# Altium footprint library Components.PcbLib: 260 footprints (part 11 of 17)
Each footprint in its own frame and in the unit in brackets; x right, y up, seen from the top. Pads: shape width x height; smd on the part's side, far side on the other; paste and mask are expansions set on the pad; w line width, h text height; cw(c..) or ccw(c..) is an arc to the next point about the centre after c.
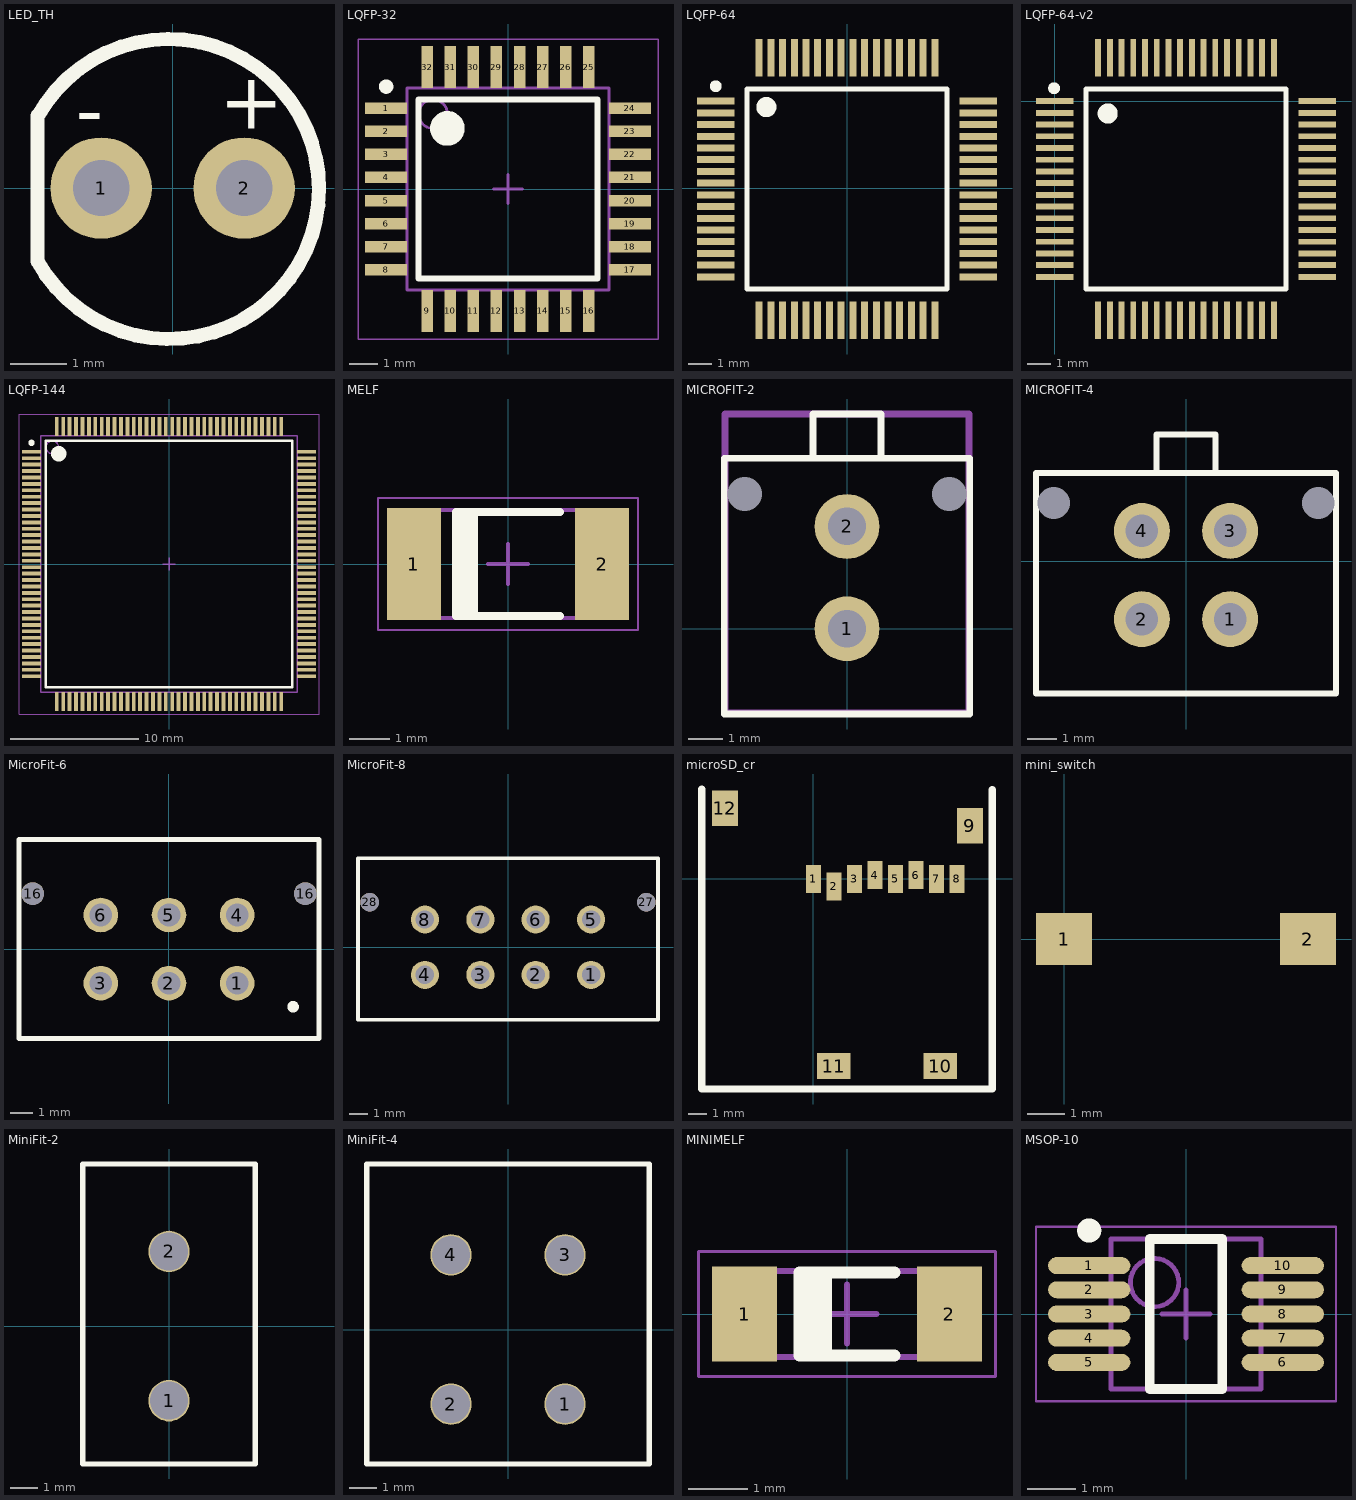
[diagram p10: the footprints below, top view; thin cyan lines are the x and y axes]

## LED_TH [mm]
pads (2):
  round 1.8 hole 1: 1(-1.27,0) 2(1.27,0)
Top Overlay:
  lines w0.254: -2.4,1.284 -2.4,-1.3 ccw(c-0.065,-0.017) -2.39,1.284
  text "-" at -1.725,0.9 h1
  text "+" at 0.825,1.05 h1

## LQFP-32 [mm]
height 1.6
pads (32):
  rect 1.45x0.4 smd: 1(-4.225,2.8) 2(-4.225,2) 3(-4.225,1.2) 4(-4.225,0.4) 5(-4.225,-0.4) 6(-4.225,-1.2) 7(-4.225,-2) 8(-4.225,-2.8) 17(4.225,-2.8) 18(4.225,-2) 19(4.225,-1.2) 20(4.225,-0.4) 21(4.225,0.4) 22(4.225,1.2) 23(4.225,2) 24(4.225,2.8)
  rect 0.4x1.45 smd: 9(-2.8,-4.225) 10(-2,-4.225) 11(-1.2,-4.225) 12(-0.4,-4.225) 13(0.4,-4.225) 14(1.2,-4.225) 15(2,-4.225) 16(2.8,-4.225) 25(2.8,4.225) 26(2,4.225) 27(1.2,4.225) 28(0.4,4.225) 29(-0.4,4.225) 30(-1.2,4.225) 31(-2,4.225) 32(-2.8,4.225)
Top Overlay:
  circle w0.25: c-4.225,3.55 r0.125
  circle w0.6: c-2.1,2.1 r0.3
  lines w0.2: -3.1,-3.1 -3.1,3.1 3.1,3.1 3.1,-3.1 -3.1,-3.1
Mechanical 13:
  circle w0.1: c-2.6,2.6 r0.5
  lines w0.1: -3.5,-3.5 -3.5,3.5 3.5,3.5 3.5,-3.5 -3.5,-3.5
Mechanical 15:
  lines w0.05: -5.2,-5.2 -5.2,5.2 5.2,5.2 5.2,-5.2 -5.2,-5.2
  lines w0.1: -0.5,0 0.5,0 ; 0,-0.5 0,0.5
3D body "LQFP-32.STEP": height 1.63, standoff -0.09, extent -4.5,-4.5 4.5,4.5

## LQFP-64 [mm]
pads (64):
  rect 1.6x0.3 smd: 1(-5.6,3.725) 2(-5.6,3.225) 3(-5.6,2.725) 4(-5.6,2.225) 5(-5.6,1.725) 6(-5.6,1.225) 7(-5.6,0.725) 8(-5.6,0.225) 9(-5.6,-0.275) 10(-5.6,-0.775) 11(-5.6,-1.275) 12(-5.6,-1.775) 13(-5.6,-2.275) 14(-5.6,-2.775) 15(-5.6,-3.275) 16(-5.6,-3.775) 33(5.6,-3.775) 34(5.6,-3.275) 35(5.6,-2.775) 36(5.6,-2.275) 37(5.6,-1.775) 38(5.6,-1.275) 39(5.6,-0.775) 40(5.6,-0.275) 41(5.6,0.225) 42(5.6,0.725) 43(5.6,1.225) 44(5.6,1.725) 45(5.6,2.225) 46(5.6,2.725) 47(5.6,3.225) 48(5.6,3.725)
  rect 0.3x1.6 smd: 17(-3.75,-5.625) 18(-3.25,-5.625) 19(-2.75,-5.625) 20(-2.25,-5.625) 21(-1.75,-5.625) 22(-1.25,-5.625) 23(-0.75,-5.625) 24(-0.25,-5.625) 25(0.25,-5.625) 26(0.75,-5.625) 27(1.25,-5.625) 28(1.75,-5.625) 29(2.25,-5.625) 30(2.75,-5.625) 31(3.25,-5.625) 32(3.75,-5.625) 49(3.75,5.575) 50(3.25,5.575) 51(2.75,5.575) 52(2.25,5.575) 53(1.75,5.575) 54(1.25,5.575) 55(0.75,5.575) 56(0.25,5.575) 57(-0.25,5.575) 58(-0.75,5.575) 59(-1.25,5.575) 60(-1.75,5.575) 61(-2.25,5.575) 62(-2.75,5.575) 63(-3.25,5.575) 64(-3.75,5.575)
Top Overlay:
  circle w0.6: c-3.441,3.471 r0.127
  circle w0.25: c-5.6,4.36 r0.127
  lines w0.2: -4.265,-4.29 -4.265,4.24 4.265,4.24 4.265,-4.29 -4.265,-4.29
3D body "LQFP64.stp": height 1.5, standoff 0, extent -5.998,-6.036 6.025,5.986

## LQFP-64-v2 [mm]
pads (64):
  rect 1.6x0.25 smd: 1(0,0) 2(0,-0.5) 3(0,-1) 4(0,-1.5) 5(0,-2) 6(0,-2.5) 7(0,-3) 8(0,-3.5) 9(0,-4) 10(0,-4.5) 11(0,-5) 12(0,-5.5) 13(0,-6) 14(0,-6.5) 15(0,-7) 16(0,-7.5) 33(11.2,-7.5) 34(11.2,-7) 35(11.2,-6.5) 36(11.2,-6) 37(11.2,-5.5) 38(11.2,-5) 39(11.2,-4.5) 40(11.2,-4) 41(11.2,-3.5) 42(11.2,-3) 43(11.2,-2.5) 44(11.2,-2) 45(11.2,-1.5) 46(11.2,-1) 47(11.2,-0.5) 48(11.2,0)
  rect 0.25x1.6 smd: 17(1.85,-9.35) 18(2.35,-9.35) 19(2.85,-9.35) 20(3.35,-9.35) 21(3.85,-9.35) 22(4.35,-9.35) 23(4.85,-9.35) 24(5.35,-9.35) 25(5.85,-9.35) 26(6.35,-9.35) 27(6.85,-9.35) 28(7.35,-9.35) 29(7.85,-9.35) 30(8.35,-9.35) 31(8.85,-9.35) 32(9.35,-9.35) 49(9.35,1.85) 50(8.85,1.85) 51(8.35,1.85) 52(7.85,1.85) 53(7.35,1.85) 54(6.85,1.85) 55(6.35,1.85) 56(5.85,1.85) 57(5.35,1.85) 58(4.85,1.85) 59(4.35,1.85) 60(3.85,1.85) 61(3.35,1.85) 62(2.85,1.85) 63(2.35,1.85) 64(1.85,1.85)
Top Overlay:
  circle w0.25: c-0.027,0.55 r0.127
  circle w0.6: c2.259,-0.529 r0.127
  lines w0.2: 1.335,-8.015 9.865,-8.015 9.865,0.515 1.335,0.515 1.335,-8.015
3D body "LQFP64.stp": height 1.5, standoff 0, extent -0.411,-9.761 11.611,2.261

## LQFP-144 [mm] "TSQFP, 144-Leads, Body 20,00x20,00mm, Pitch 0,50mm, IPC Medium Density"
height 1.6
pads (144):
  rect 1.45x0.3 smd: 1(-10.725,8.75) 2(-10.725,8.25) 3(-10.725,7.75) 4(-10.725,7.25) 5(-10.725,6.75) 6(-10.725,6.25) 7(-10.725,5.75) 8(-10.725,5.25) 9(-10.725,4.75) 10(-10.725,4.25) 11(-10.725,3.75) 12(-10.725,3.25) 13(-10.725,2.75) 14(-10.725,2.25) 15(-10.725,1.75) 16(-10.725,1.25) 17(-10.725,0.75) 18(-10.725,0.25) 19(-10.725,-0.25) 20(-10.725,-0.75) 21(-10.725,-1.25) 22(-10.725,-1.75) 23(-10.725,-2.25) 24(-10.725,-2.75) 25(-10.725,-3.25) 26(-10.725,-3.75) 27(-10.725,-4.25) 28(-10.725,-4.75) 29(-10.725,-5.25) 30(-10.725,-5.75) 31(-10.725,-6.25) 32(-10.725,-6.75) 33(-10.725,-7.25) 34(-10.725,-7.75) 35(-10.725,-8.25) 36(-10.725,-8.75) 73(10.725,-8.75) 74(10.725,-8.25) 75(10.725,-7.75) 76(10.725,-7.25) 77(10.725,-6.75) 78(10.725,-6.25) 79(10.725,-5.75) 80(10.725,-5.25) 81(10.725,-4.75) 82(10.725,-4.25) 83(10.725,-3.75) 84(10.725,-3.25) 85(10.725,-2.75) 86(10.725,-2.25) 87(10.725,-1.75) 88(10.725,-1.25) 89(10.725,-0.75) 90(10.725,-0.25) 91(10.725,0.25) 92(10.725,0.75) 93(10.725,1.25) 94(10.725,1.75) 95(10.725,2.25) 96(10.725,2.75) 97(10.725,3.25) 98(10.725,3.75) 99(10.725,4.25) 100(10.725,4.75) 101(10.725,5.25) 102(10.725,5.75) 103(10.725,6.25) 104(10.725,6.75) 105(10.725,7.25) 106(10.725,7.75) 107(10.725,8.25) 108(10.725,8.75)
  rect 0.3x1.45 smd: 37(-8.75,-10.725) 38(-8.25,-10.725) 39(-7.75,-10.725) 40(-7.25,-10.725) 41(-6.75,-10.725) 42(-6.25,-10.725) 43(-5.75,-10.725) 44(-5.25,-10.725) 45(-4.75,-10.725) 46(-4.25,-10.725) 47(-3.75,-10.725) 48(-3.25,-10.725) 49(-2.75,-10.725) 50(-2.25,-10.725) 51(-1.75,-10.725) 52(-1.25,-10.725) 53(-0.75,-10.725) 54(-0.25,-10.725) 55(0.25,-10.725) 56(0.75,-10.725) 57(1.25,-10.725) 58(1.75,-10.725) 59(2.25,-10.725) 60(2.75,-10.725) 61(3.25,-10.725) 62(3.75,-10.725) 63(4.25,-10.725) 64(4.75,-10.725) 65(5.25,-10.725) 66(5.75,-10.725) 67(6.25,-10.725) 68(6.75,-10.725) 69(7.25,-10.725) 70(7.75,-10.725) 71(8.25,-10.725) 72(8.75,-10.725) 109(8.75,10.725) 110(8.25,10.725) 111(7.75,10.725) 112(7.25,10.725) 113(6.75,10.725) 114(6.25,10.725) 115(5.75,10.725) 116(5.25,10.725) 117(4.75,10.725) 118(4.25,10.725) 119(3.75,10.725) 120(3.25,10.725) 121(2.75,10.725) 122(2.25,10.725) 123(1.75,10.725) 124(1.25,10.725) 125(0.75,10.725) 126(0.25,10.725) 127(-0.25,10.725) 128(-0.75,10.725) 129(-1.25,10.725) 130(-1.75,10.725) 131(-2.25,10.725) 132(-2.75,10.725) 133(-3.25,10.725) 134(-3.75,10.725) 135(-4.25,10.725) 136(-4.75,10.725) 137(-5.25,10.725) 138(-5.75,10.725) 139(-6.25,10.725) 140(-6.75,10.725) 141(-7.25,10.725) 142(-7.75,10.725) 143(-8.25,10.725) 144(-8.75,10.725)
Top Overlay:
  circle w0.6: c-8.6,8.6 r0.3
  circle w0.25: c-10.725,9.45 r0.125
  lines w0.2: -9.6,-9.6 9.6,-9.6 9.6,9.6 -9.6,9.6 -9.6,-9.6
Mechanical 13:
  circle w0.1: c-9.1,9.1 r0.5
  lines w0.1: -10,-10 10,-10 10,10 -10,10 -10,-10
Mechanical 15:
  lines w0.05: -11.7,-11.7 11.7,-11.7 11.7,11.7 -11.7,11.7 -11.7,-11.7
  lines w0.1: -0.5,0 0.5,0 ; 0,-0.5 0,0.5
3D body "LQFP-144.step": height 1.58, standoff -0.02, extent -11,-11 11,11

## MELF [mm]
height 2.7
pads (2):
  rect 1.35x2.8 smd: 1(-2.35,0) 2(2.35,0)
Top Overlay:
  rectangle: -1.3,-1.3 -0.75,1.3
  lines w0.2: 1.3,-1.3 -1.3,-1.3 -1.3,1.3 1.3,1.3
Mechanical 13:
  lines w0.1: -2.6,-1.35 -2.6,1.35 2.6,1.35 2.6,-1.35 -2.6,-1.35
Mechanical 15:
  lines w0.05: -3.25,-1.65 -3.25,1.65 3.25,1.65 3.25,-1.65 -3.25,-1.65
  lines w0.1: -0.5,0 0.5,0 ; 0,-0.5 0,0.5
3D body: height 2.7, standoff 0, extent -2.6,-1.35 -2.04,1.349
3D body: height 2.69, standoff 0.04, extent -1.44,-1.321 -0.84,1.32
3D body: height 2.69, standoff 0.05, extent -2.04,-1.32 2.04,1.32
3D body: height 2.7, standoff 0, extent 2.04,-1.35 2.6,1.349

## MICROFIT-2 [mm] "Microfit 43045-0227 2 pin header, pitch: 3mm"
height 9.9
pads (4):
  round 0 hole 1 unplated paste+0 mask+0: 0(-3,3.95) 0(3,3.95)
  round 1.9 hole 1.1: 1(0,0) 2(0,3)
Top Overlay:
  lines w0.2: -1,5 -1,6.3 1,6.3 1,5 ; -3.6,-2.5 3.6,-2.5 3.6,5 -3.6,5 -3.6,-2.5
Mechanical 13:
  lines w0.2: -3.575,-2.47 3.575,-2.47 3.575,6.3 -3.575,6.3 -3.575,-2.47
3D body "microfit_2pin_43045-0227.stp": height 9.92, standoff -3.17, extent -3.575,-2.47 3.575,6.3

## MICROFIT-4 [mm] "Microfit 43045-0427 4 pin header, pitch: 3mm"
height 9.9
pads (6):
  round 0 hole 1.1 unplated paste+0 mask+0: 0(-4.5,1.975) 0(4.5,1.975)
  round 1.9 hole 1.1: 1(1.5,-1.975) 2(-1.5,-1.975) 3(1.5,1.025) 4(-1.5,1.025)
Top Overlay:
  lines w0.2: -1,3 -1,4.3 1,4.3 1,3 ; -5.1,-4.5 5.1,-4.5 5.1,3 -5.1,3 -5.1,-4.5
3D body "microfit_4pin_43045-0427.stp": height 9.92, standoff -3.17, extent -5.075,-4.47 5.075,4.3

## MicroFit-6 [mm]
pads (8):
  round 1.524 hole 1: 1(3,-1.5) 2(0,-1.5) 3(-3,-1.5) 4(3,1.5) 5(0,1.5) 6(-3,1.5)
  round 1 hole 1 unplated paste+0 mask+0: 16(-6,2.44) 16(6,2.44)
Top Overlay:
  circle w0.254: c5.461,-2.54 r0.127
  lines w0.2: -6.604,-3.937 6.604,-3.937 6.604,4.826 -6.604,4.826 -6.604,-3.937
3D body "430450612.stp": height 9.95, standoff -3.14, extent -6.575,-3.97 6.575,4.8

## MicroFit-8 [mm]
pads (10):
  round 1.524 hole 1: 1(4.5,-1.5) 2(1.5,-1.5) 3(-1.5,-1.5) 4(-4.5,-1.5) 5(4.5,1.5) 6(1.5,1.5) 7(-1.5,1.5) 8(-4.5,1.5)
  round 1 hole 1 unplated: 27(7.5,2.44) 28(-7.5,2.44)
Top Overlay:
  lines w0.2: -8.128,-3.937 -8.128,4.826 8.128,4.826 8.128,-3.937 -8.128,-3.937
3D body "430450812.stp": height 9.95, standoff -3.14, extent -8.075,-3.97 8.075,4.8

## microSD_cr [mm]
pads (12):
  rect 0.8x1.5 smd: 1(0,0) 2(1.1,-0.4) 3(2.2,0) 4(3.3,0.2) 5(4.4,0) 6(5.5,0.2) 7(6.6,0) 8(7.7,0)
  rect 1.4x1.9 smd: 9(8.4,2.85) 12(-4.75,3.8)
  rect 1.8x1.4 smd: 10(6.8,-10.05) 11(1.1,-10.05)
Top Overlay:
  lines w0.4: -6,4.825 -6,-11.275 9.6,-11.275 9.6,4.775
3D body: height 1.85, standoff 0, extent -5.575,-10.8 9.2,4.925

## mini_switch [mm]
pads (2):
  rect 1.5x1.4 smd: 1(0,0) 2(6.5,0)
3D body: height 1.7, standoff 0, extent 0.25,-1.9 6.25,1.9
3D body: height 2.5, standoff 0, extent 2.3,-0.95 4.2,0.95

## MiniFit-2 [mm]
pads (2):
  round 1.524 hole 1.4: 1(0,-2.75) 2(0,2.75)
Top Overlay:
  lines w0.2: -3.175,-5.08 -3.175,5.969 3.175,5.969 3.175,-5.08 -3.175,-5.08
3D body "039288020.stp": height 12.8, standoff -3.5, extent -3.1,-5.054 3.1,5.946

## MiniFit-4 [mm]
pads (4):
  round 1.524 hole 1.4: 1(2.1,-2.75) 2(-2.1,-2.75) 3(2.1,2.75) 4(-2.1,2.75)
Top Overlay:
  lines w0.2: -5.207,-4.953 -5.207,6.096 5.207,6.096 5.207,-4.953 -5.207,-4.953
3D body "039281043.stp": height 12.8, standoff -3.5, extent -5.2,-4.927 5.2,6.073

## MINIMELF [mm]
height 1.45
pads (2):
  rect 1.1x1.6 smd: 1(-1.725,0) 2(1.725,0)
Top Overlay:
  rectangle: -0.8,-0.7 -0.25,0.7
  lines w0.2: 0.8,-0.7 -0.8,-0.7 -0.8,0.7 0.8,0.7
Mechanical 13:
  lines w0.1: -1.85,-0.725 -1.85,0.725 1.85,0.725 1.85,-0.725 -1.85,-0.725
Mechanical 15:
  lines w0.05: -2.5,-1.05 -2.5,1.05 2.5,1.05 2.5,-1.05 -2.5,-1.05
  lines w0.1: -0.5,0 0.5,0 ; 0,-0.5 0,0.5
3D body: height 1.45, standoff 0, extent -1.85,-0.725 -1.5,0.725
3D body: height 1.44, standoff 0.04, extent -0.9,-0.696 -0.3,0.696
3D body: height 1.44, standoff 0.05, extent -1.5,-0.695 1.5,0.694
3D body: height 1.45, standoff 0, extent 1.5,-0.725 1.85,0.725

## MSOP-10 [mm]
height 1.1
pads (10):
  oval 1.7x0.35 smd: 1(-2,1) 2(-2,0.5) 3(-2,0) 4(-2,-0.5) 5(-2,-1) 6(2,-1) 7(2,-0.5) 8(2,0) 9(2,0.5) 10(2,1)
Top Overlay:
  circle w0.25: c-2,1.725 r0.125
  lines w0.2: -0.75,-1.55 -0.75,1.55 0.75,1.55 0.75,-1.55 -0.75,-1.55
Mechanical 13:
  circle w0.1: c-0.65,0.65 r0.5
  lines w0.1: -1.55,-1.55 -1.55,1.55 1.55,1.55 1.55,-1.55 -1.55,-1.55
Mechanical 15:
  lines w0.05: -3.1,-1.8 -3.1,1.8 3.1,1.8 3.1,-1.8 -3.1,-1.8
  lines w0.1: -0.5,0 0.5,0 ; 0,-0.5 0,0.5
3D body "MSOP-10.step": height 1.15, standoff 0, extent -2.45,-1.5 2.45,1.5